# Altium integrated library GPDSE.IntLib: 634 symbols (part 5 of 7) (continued)
## Header_2x6
designator P?
Header, 2 Lines, 6 Columns, 12 Pins; LatestRevisionDate: 17-Jul-2002; LatestRevisionNote: Re-released for DXP Platform.; Publisher: Altium Limited
footprint HDR-F-2x6-1.27mm-SMD-4.57mm (Female Header, 2 lines, 6 columns, SMD, 4.57 mm length, 3D ASSMANN WSW components)
footprint HDR-M-2x6-2.54mm-180-9.2mm (Male Header, 2 lines, 6 columns, 180 degrees, 9.2 mm length)
footprint HDR-F-2x6-2.54mm-180-8.7mm (Female Header, 2 lines, 6 columns, 180 degrees, 8.7 mm length, 3D ASSMANN WSW components)
pins: 1, 2, 3, 4, 5, 6, 7, 8, 9, 10, 11, 12

## Header_2x7
designator P?
Header, 2 Lines, 7 Columns, 14 Pins; LatestRevisionDate: 17-Jul-2002; LatestRevisionNote: Re-released for DXP Platform.; Publisher: Altium Limited
footprint HDR-F-2x7-1.27mm-SMD-4.57mm (Female Header, 2 lines, 7 columns, SMD, 4.57 mm length, 3D ASSMANN WSW components)
footprint HDR-F-2x7-2.54mm-180-8.7mm (Female Header, 2 lines, 7 columns, 180 degrees, 8.7 mm length, 3D ASSMANN WSW components)
pins: 1, 2, 3, 4, 5, 6, 7, 8, 9, 10, 11, 12, 13, 14

## Header_2x8
designator P?
Header, 2 Lines, 8 Columns, 16 Pins; LatestRevisionDate: 17-Jul-2002; LatestRevisionNote: Re-released for DXP Platform.; Publisher: Altium Limited
footprint HDR-F-2x8-1.27mm-SMD-4.57mm (Female Header, 2 lines, 8 columns, SMD, 4.57 mm length, 3D ASSMANN WSW components)
footprint HDR-F-2x8-2.54mm-180-8.7mm (Female Header, 2 lines, 8 columns, 180 degrees, 8.7 mm length, 3D ASSMANN WSW components)
pins: 1, 2, 3, 4, 5, 6, 7, 8, 9, 10, 11, 12, 13, 14, 15, 16

## Header_2x9
designator P?
Header, 2 Lines, 9 Columns, 18 Pins; LatestRevisionDate: 17-Jul-2002; LatestRevisionNote: Re-released for DXP Platform.; Publisher: Altium Limited
footprint HDR-F-2x9-1.27mm-SMD-4.57mm (Female Header, 2 lines, 9 columns, SMD, 4.57 mm length, 3D ASSMANN WSW components)
footprint HDR-F-2x9-2.54mm-180-8.7mm (Female Header, 2 lines, 9 columns, 180 degrees, 8.7 mm length, 3D ASSMANN WSW components)
pins: 1, 2, 3, 4, 5, 6, 7, 8, 9, 10, 11, 12, 13, 14, 15, 16, 17, 18

## Header_2x10
designator P?
Header, 2 Lines, 10 Columns, 20 Pins; LatestRevisionDate: 17-Jul-2002; LatestRevisionNote: Re-released for DXP Platform.; Publisher: Altium Limited
footprint HDR-F-2x10-1.27mm-SMD-4.57mm (Female Header, 2 lines, 10 columns, SMD, 4.57 mm length, 3D ASSMANN WSW components)
footprint HDR-F-2x10-2.54mm-180-8.7mm (Female Header, 2 lines, 10 columns, 180 degrees, 8.7 mm length, 3D ASSMANN WSW components)
pins: 1, 2, 3, 4, 5, 6, 7, 8, 9, 10, 11, 12, 13, 14, 15, 16, 17, 18, 19, 20

## Header_2x11
designator P?
Header, 2 Lines, 11 Columns, 22 Pins; LatestRevisionDate: 17-Jul-2002; LatestRevisionNote: Re-released for DXP Platform.; Publisher: Altium Limited
footprint HDR-F-2x11-1.27mm-SMD-4.57mm (Female Header, 2 lines, 11 columns, SMD, 4.57 mm length, 3D ASSMANN WSW components)
footprint HDR-F-2x11-2.54mm-180-8.7mm (Female Header, 2 lines, 11 columns, 180 degrees, 8.7 mm length, 3D ASSMANN WSW components)
pins: 1, 2, 3, 4, 5, 6, 7, 8, 9, 10, 11, 12, 13, 14, 15, 16, 17, 18, 19, 20, 21, 22

## Header_2x12
designator P?
Header, 2 Lines, 12 Columns, 24 Pins; LatestRevisionDate: 17-Jul-2002; LatestRevisionNote: Re-released for DXP Platform.; Publisher: Altium Limited
footprint HDR-F-2x12-1.27mm-SMD-4.57mm (Female Header, 2 lines, 12 columns, SMD, 4.57 mm length, 3D ASSMANN WSW components)
footprint HDR-F-2x12-2.54mm-180-8.7mm (Female Header, 2 lines, 12 columns, 180 degrees, 8.7 mm length, 3D ASSMANN WSW components)
pins: 1, 2, 3, 4, 5, 6, 7, 8, 9, 10, 11, 12, 13, 14, 15, 16, 17, 18, 19, 20, 21, 22, 23, 24

## Header_2x13
designator P?
Header, 2 Lines, 13 Columns, 26 Pins; LatestRevisionDate: 17-Jul-2002; LatestRevisionNote: Re-released for DXP Platform.; Publisher: Altium Limited
footprint HDR-F-2x13-1.27mm-SMD-4.57mm (Female Header, 2 lines, 13 columns, SMD, 4.57 mm length, 3D ASSMANN WSW components)
footprint HDR-F-2x13-2.54mm-180-8.7mm (Female Header, 2 lines, 13 columns, 180 degrees, 8.7 mm length, 3D ASSMANN WSW components)
pins: 1, 2, 3, 4, 5, 6, 7, 8, 9, 10, 11, 12, 13, 14, 15, 16, 17, 18, 19, 20, 21, 22, 23, 24, 25, 26

## Header_2x14
designator P?
Header, 2 Lines, 14 Columns, 28 Pins; LatestRevisionDate: 17-Jul-2002; LatestRevisionNote: Re-released for DXP Platform.; Publisher: Altium Limited
footprint HDR-F-2x14-1.27mm-SMD-4.57mm (Female Header, 2 lines, 14 columns, SMD, 4.57 mm length, 3D ASSMANN WSW components)
footprint HDR-F-2x14-2.54mm-180-8.7mm (Female Header, 2 lines, 14 columns, 180 degrees, 8.7 mm length, 3D ASSMANN WSW components)
pins: 1, 2, 3, 4, 5, 6, 7, 8, 9, 10, 11, 12, 13, 14, 15, 16, 17, 18, 19, 20, 21, 22, 23, 24, 25, 26, 27, 28

## Header_2x15
designator P?
Header, 2 Lines, 15 Columns, 30 Pins; LatestRevisionDate: 17-Jul-2002; LatestRevisionNote: Re-released for DXP Platform.; Publisher: Altium Limited
footprint HDR-F-2x15-1.27mm-SMD-4.57mm (Female Header, 2 lines, 15 columns, SMD, 4.57 mm length, 3D ASSMANN WSW components)
footprint HDR-F-2x15-2.54mm-180-8.7mm (Female Header, 2 lines, 15 columns, 180 degrees, 8.7 mm length, 3D ASSMANN WSW components)
pins: 1, 2, 3, 4, 5, 6, 7, 8, 9, 10, 11, 12, 13, 14, 15, 16, 17, 18, 19, 20, 21, 22, 23, 24, 25, 26, 27, 28, 29, 30

## Header_2x16
designator P?
Header, 2 Lines, 16 Columns, 32 Pins; LatestRevisionDate: 17-Jul-2002; LatestRevisionNote: Re-released for DXP Platform.; Publisher: Altium Limited
footprint HDR-F-2x16-1.27mm-SMD-4.57mm (Female Header, 2 lines, 16 columns, SMD, 4.57 mm length, 3D ASSMANN WSW components)
footprint HDR-M-2x16-2.54mm-180-9.2mm (Male Header, 2 lines, 16 columns, 180 degrees, 9.2 mm length)
footprint HDR-F-2x16-2.54mm-180-8.7mm (Female Header, 2 lines, 16 columns, 180 degrees, 8.7 mm length, 3D ASSMANN WSW components)
pins: 1, 2, 3, 4, 5, 6, 7, 8, 9, 10, 11, 12, 13, 14, 15, 16, 17, 18, 19, 20, 21, 22, 23, 24, 25, 26, 27, 28, 29, 30, 31, 32

## Header_2x17
designator P?
Header, 2 Lines, 17 Columns, 34 Pins; LatestRevisionDate: 17-Jul-2002; LatestRevisionNote: Re-released for DXP Platform.; Publisher: Altium Limited
footprint HDR-F-2x17-1.27mm-SMD-4.57mm (Female Header, 2 lines, 17 columns, SMD, 4.57 mm length, 3D ASSMANN WSW components)
footprint HDR-F-2x17-2.54mm-180-8.7mm (Female Header, 2 lines, 17 columns, 180 degrees, 8.7 mm length, 3D ASSMANN WSW components)
pins: 1, 2, 3, 4, 5, 6, 7, 8, 9, 10, 11, 12, 13, 14, 15, 16, 17, 18, 19, 20, 21, 22, 23, 24, 25, 26, 27, 28, 29, 30, 31, 32, 33, 34

## Header_2x18
designator P?
Header, 2 Lines, 18 Columns, 36 Pins; LatestRevisionDate: 17-Jul-2002; LatestRevisionNote: Re-released for DXP Platform.; Publisher: Altium Limited
footprint HDR-F-2x18-1.27mm-SMD-4.57mm (Female Header, 2 lines, 18 columns, SMD, 4.57 mm length, 3D ASSMANN WSW components)
footprint HDR-F-2x18-2.54mm-180-8.7mm (Female Header, 2 lines, 18 columns, 180 degrees, 8.7 mm length, 3D ASSMANN WSW components)
pins: 1, 2, 3, 4, 5, 6, 7, 8, 9, 10, 11, 12, 13, 14, 15, 16, 17, 18, 19, 20, 21, 22, 23, 24, 25, 26, 27, 28, 29, 30, 31, 32, 33, 34, 35, 36

## Header_2x19
designator P?
Header, 2 Lines, 19 Columns, 38 Pins; LatestRevisionDate: 17-Jul-2002; LatestRevisionNote: Re-released for DXP Platform.; Publisher: Altium Limited
footprint HDR-F-2x19-1.27mm-SMD-4.57mm (Female Header, 2 lines, 19 columns, SMD, 4.57 mm length, 3D ASSMANN WSW components)
footprint HDR-F-2x19-2.54mm-180-8.7mm (Female Header, 2 lines, 19 columns, 180 degrees, 8.7 mm length, 3D ASSMANN WSW components)
pins: 1, 2, 3, 4, 5, 6, 7, 8, 9, 10, 11, 12, 13, 14, 15, 16, 17, 18, 19, 20, 21, 22, 23, 24, 25, 26, 27, 28, 29, 30, 31, 32, 33, 34, 35, 36, 37, 38

## Header_2x20
designator P?
Header, 2 Lines, 20 Columns, 40 Pins; LatestRevisionDate: 17-Jul-2002; LatestRevisionNote: Re-released for DXP Platform.; Publisher: Altium Limited
footprint HDR-M-2x20-2.54mm-180-9.2mm (Male Header, 2 lines 20 rows, 180 degrees, 9.2 mm length)
footprint HDR-F-2x20-1.27mm-SMD-4.57mm (Female Header, 2 lines, 20 columns, SMD, 4.57 mm length, 3D ASSMANN WSW components)
footprint HDR-F-2x20-2.54mm-180-8.7mm (Female Header, 2 lines, 20 columns, 180 degrees, 8.7 mm length, 3D ASSMANN WSW components)
pins: 1, 2, 3, 4, 5, 6, 7, 8, 9, 10, 11, 12, 13, 14, 15, 16, 17, 18, 19, 20, 21, 22, 23, 24, 25, 26, 27, 28, 29, 30, 31, 32, 33, 34, 35, 36, 37, 38, 39, 40

## Header_2x21
designator P?
Header, 2 Lines, 21 Columns, 42 Pins; LatestRevisionDate: 17-Jul-2002; LatestRevisionNote: Re-released for DXP Platform.; Publisher: Altium Limited
footprint HDR-F-2x21-1.27mm-SMD-4.57mm (Female Header, 2 lines, 21 columns, SMD, 4.57 mm length, 3D ASSMANN WSW components)
footprint HDR-F-2x21-2.54mm-180-8.7mm (Female Header, 2 lines, 21 columns, 180 degrees, 8.7 mm length, 3D ASSMANN WSW components)
pins: 1, 2, 3, 4, 5, 6, 7, 8, 9, 10, 11, 12, 13, 14, 15, 16, 17, 18, 19, 20, 21, 22, 23, 24, 25, 26, 27, 28, 29, 30, 31, 32, 33, 34, 35, 36, 37, 38, 39, 40, 41, 42

## Header_2x22
designator P?
Header, 2 Lines, 22 Columns, 44 Pins; LatestRevisionDate: 17-Jul-2002; LatestRevisionNote: Re-released for DXP Platform.; Publisher: Altium Limited
footprint HDR-F-2x22-1.27mm-SMD-4.57mm (Female Header, 2 lines, 22 columns, SMD, 4.57 mm length, 3D ASSMANN WSW components)
footprint HDR-F-2x22-2.54mm-180-8.7mm (Female Header, 2 lines, 22 columns, 180 degrees, 8.7 mm length, 3D ASSMANN WSW components)
pins: 1, 2, 3, 4, 5, 6, 7, 8, 9, 10, 11, 12, 13, 14, 15, 16, 17, 18, 19, 20, 21, 22, 23, 24, 25, 26, 27, 28, 29, 30, 31, 32, 33, 34, 35, 36, 37, 38, 39, 40, 41, 42, 43, 44

## Header_2x23
designator P?
Header, 2 Lines, 23 Columns, 46 Pins; LatestRevisionDate: 17-Jul-2002; LatestRevisionNote: Re-released for DXP Platform.; Publisher: Altium Limited
footprint HDR-F-2x23-1.27mm-SMD-4.57mm (Female Header, 2 lines, 23 columns, SMD, 4.57 mm length, 3D ASSMANN WSW components)
footprint HDR-F-2x23-2.54mm-180-8.7mm (Female Header, 2 lines, 23 columns, 180 degrees, 8.7 mm length, 3D ASSMANN WSW components)
pins: 1, 2, 3, 4, 5, 6, 7, 8, 9, 10, 11, 12, 13, 14, 15, 16, 17, 18, 19, 20, 21, 22, 23, 24, 25, 26, 27, 28, 29, 30, 31, 32, 33, 34, 35, 36, 37, 38, 39, 40, 41, 42, 43, 44, 45, 46

## Header_2x24
designator P?
Header, 2 Lines, 24 Columns, 48 Pins; LatestRevisionDate: 17-Jul-2002; LatestRevisionNote: Re-released for DXP Platform.; Publisher: Altium Limited
footprint HDR-F-2x24-1.27mm-SMD-4.57mm (Female Header, 2 lines, 24 columns, SMD, 4.57 mm length, 3D ASSMANN WSW components)
footprint HDR-F-2x24-2.54mm-180-8.7mm (Female Header, 2 lines, 24 columns, 180 degrees, 8.7 mm length, 3D ASSMANN WSW components)
pins: 1, 2, 3, 4, 5, 6, 7, 8, 9, 10, 11, 12, 13, 14, 15, 16, 17, 18, 19, 20, 21, 22, 23, 24, 25, 26, 27, 28, 29, 30, 31, 32, 33, 34, 35, 36, 37, 38, 39, 40, 41, 42, 43, 44, 45, 46, 47, 48

## Header_2x25
designator P?
Header, 2 Lines, 25 Columns, 50 Pins; LatestRevisionDate: 17-Jul-2002; LatestRevisionNote: Re-released for DXP Platform.; Publisher: Altium Limited
footprint HDR-F-2x25-1.27mm-SMD-4.57mm (Female Header, 2 lines, 25 columns, SMD, 4.57 mm length, 3D ASSMANN WSW components)
footprint HDR-F-2x25-2.54mm-180-8.7mm (Female Header, 2 lines, 25 columns, 180 degrees, 8.7 mm length, 3D ASSMANN WSW components)
pins: 1, 2, 3, 4, 5, 6, 7, 8, 9, 10, 11, 12, 13, 14, 15, 16, 17, 18, 19, 20, 21, 22, 23, 24, 25, 26, 27, 28, 29, 30, 31, 32, 33, 34, 35, 36, 37, 38, 39, 40, 41, 42, 43, 44, 45, 46, 47, 48, 49, 50

## Header_2x26
designator P?
Header, 2 Lines, 26 Columns, 52 Pins; LatestRevisionDate: 17-Jul-2002; LatestRevisionNote: Re-released for DXP Platform.; Publisher: Altium Limited
footprint HDR-F-2x26-2.54mm-180-8.7mm (Female Header, 2 lines, 26 columns, 180 degrees, 8.7 mm length, 3D ASSMANN WSW components)
pins: 1, 2, 3, 4, 5, 6, 7, 8, 9, 10, 11, 12, 13, 14, 15, 16, 17, 18, 19, 20, 21, 22, 23, 24, 25, 26, 27, 28, 29, 30, 31, 32, 33, 34, 35, 36, 37, 38, 39, 40, 41, 42, 43, 44, 45, 46, 47, 48, 49, 50, 51, 52

## Header_2x27
designator P?
Header, 2 Lines, 27 Columns, 54 Pins; LatestRevisionDate: 17-Jul-2002; LatestRevisionNote: Re-released for DXP Platform.; Publisher: Altium Limited
footprint HDR-F-2x27-2.54mm-180-8.7mm (Female Header, 2 lines, 27 columns, 180 degrees, 8.7 mm length, 3D ASSMANN WSW components)
pins: 1, 2, 3, 4, 5, 6, 7, 8, 9, 10, 11, 12, 13, 14, 15, 16, 17, 18, 19, 20, 21, 22, 23, 24, 25, 26, 27, 28, 29, 30, 31, 32, 33, 34, 35, 36, 37, 38, 39, 40, 41, 42, 43, 44, 45, 46, 47, 48, 49, 50, 51, 52, 53, 54

## Header_2x28
designator P?
Header, 2 Lines, 28 Columns, 56 Pins; LatestRevisionDate: 17-Jul-2002; LatestRevisionNote: Re-released for DXP Platform.; Publisher: Altium Limited
footprint HDR-F-2x28-2.54mm-180-8.7mm (Female Header, 2 lines, 28 columns, 180 degrees, 8.7 mm length, 3D ASSMANN WSW components)
pins: 1, 2, 3, 4, 5, 6, 7, 8, 9, 10, 11, 12, 13, 14, 15, 16, 17, 18, 19, 20, 21, 22, 23, 24, 25, 26, 27, 28, 29, 30, 31, 32, 33, 34, 35, 36, 37, 38, 39, 40, 41, 42, 43, 44, 45, 46, 47, 48, 49, 50, 51, 52, 53, 54, 55, 56

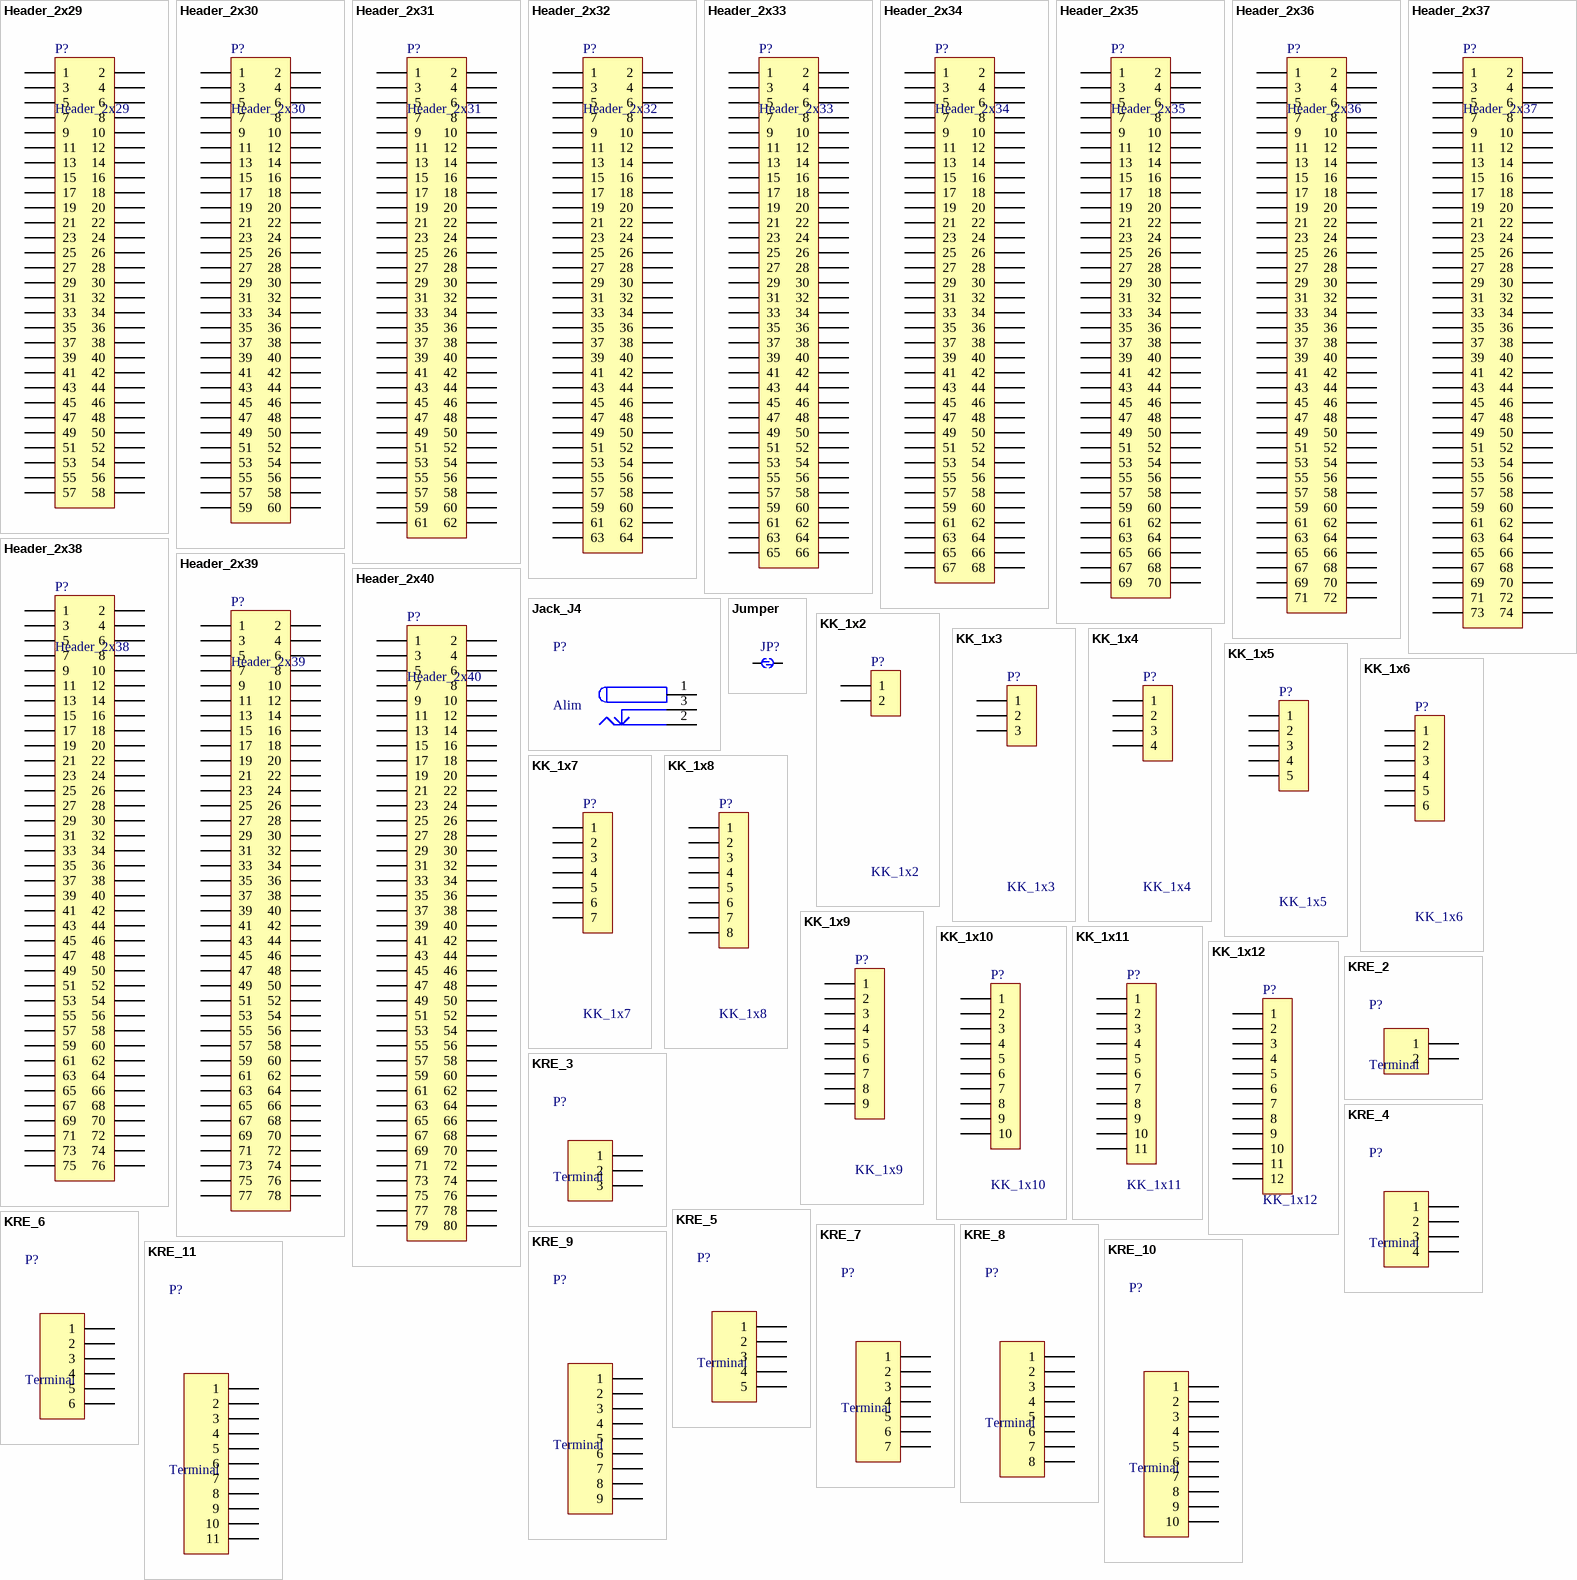
[diagram p22: symbols Header_2x29 to KRE_11]

## Header_2x29
designator P?
Header, 2 Lines, 29 Columns, 58 Pins; LatestRevisionDate: 17-Jul-2002; LatestRevisionNote: Re-released for DXP Platform.; Publisher: Altium Limited
footprint HDR-F-2x29-2.54mm-180-8.7mm (Female Header, 2 lines, 29 columns, 180 degrees, 8.7 mm length, 3D ASSMANN WSW components)
pins: 1, 2, 3, 4, 5, 6, 7, 8, 9, 10, 11, 12, 13, 14, 15, 16, 17, 18, 19, 20, 21, 22, 23, 24, 25, 26, 27, 28, 29, 30, 31, 32, 33, 34, 35, 36, 37, 38, 39, 40, 41, 42, 43, 44, 45, 46, 47, 48, 49, 50, 51, 52, 53, 54, 55, 56, 57, 58

## Header_2x30
designator P?
Header, 2 Lines, 30 Columns, 60 Pins; LatestRevisionDate: 17-Jul-2002; LatestRevisionNote: Re-released for DXP Platform.; Publisher: Altium Limited
footprint HDR-F-2x30-2.54mm-180-8.7mm (Female Header, 2 lines, 30 columns, 180 degrees, 8.7 mm length, 3D ASSMANN WSW components)
pins: 1, 2, 3, 4, 5, 6, 7, 8, 9, 10, 11, 12, 13, 14, 15, 16, 17, 18, 19, 20, 21, 22, 23, 24, 25, 26, 27, 28, 29, 30, 31, 32, 33, 34, 35, 36, 37, 38, 39, 40, 41, 42, 43, 44, 45, 46, 47, 48, 49, 50, 51, 52, 53, 54, 55, 56, 57, 58, 59, 60

## Header_2x31
designator P?
Header, 2 Lines, 31 Columns, 62 Pins; LatestRevisionDate: 17-Jul-2002; LatestRevisionNote: Re-released for DXP Platform.; Publisher: Altium Limited
footprint HDR-F-2x31-2.54mm-180-8.7mm (Female Header, 2 lines, 31 columns, 180 degrees, 8.7 mm length, 3D ASSMANN WSW components)
pins: 1, 2, 3, 4, 5, 6, 7, 8, 9, 10, 11, 12, 13, 14, 15, 16, 17, 18, 19, 20, 21, 22, 23, 24, 25, 26, 27, 28, 29, 30, 31, 32, 33, 34, 35, 36, 37, 38, 39, 40, 41, 42, 43, 44, 45, 46, 47, 48, 49, 50, 51, 52, 53, 54, 55, 56, 57, 58, 59, 60, 61, 62

## Header_2x32
designator P?
Header, 2 Lines, 32 Columns, 64 Pins; LatestRevisionDate: 17-Jul-2002; LatestRevisionNote: Re-released for DXP Platform.; Publisher: Altium Limited
footprint HDR-F-2x32-2.54mm-180-8.7mm (Female Header, 2 lines, 32 columns, 180 degrees, 8.7 mm length, 3D ASSMANN WSW components)
pins: 1, 2, 3, 4, 5, 6, 7, 8, 9, 10, 11, 12, 13, 14, 15, 16, 17, 18, 19, 20, 21, 22, 23, 24, 25, 26, 27, 28, 29, 30, 31, 32, 33, 34, 35, 36, 37, 38, 39, 40, 41, 42, 43, 44, 45, 46, 47, 48, 49, 50, 51, 52, 53, 54, 55, 56, 57, 58, 59, 60, 61, 62, 63, 64

## Header_2x33
designator P?
Header, 2 Lines, 33 Columns, 66 Pins; LatestRevisionDate: 17-Jul-2002; LatestRevisionNote: Re-released for DXP Platform.; Publisher: Altium Limited
footprint HDR-F-2x33-2.54mm-180-8.7mm (Female Header, 2 lines, 33 columns, 180 degrees, 8.7 mm length, 3D ASSMANN WSW components)
pins: 1, 2, 3, 4, 5, 6, 7, 8, 9, 10, 11, 12, 13, 14, 15, 16, 17, 18, 19, 20, 21, 22, 23, 24, 25, 26, 27, 28, 29, 30, 31, 32, 33, 34, 35, 36, 37, 38, 39, 40, 41, 42, 43, 44, 45, 46, 47, 48, 49, 50, 51, 52, 53, 54, 55, 56, 57, 58, 59, 60, 61, 62, 63, 64, 65, 66

## Header_2x34
designator P?
Header, 2 Lines, 34 Columns, 68 Pins; LatestRevisionDate: 17-Jul-2002; LatestRevisionNote: Re-released for DXP Platform.; Publisher: Altium Limited
footprint HDR-F-2x34-2.54mm-180-8.7mm (Female Header, 2 lines, 34 columns, 180 degrees, 8.7 mm length, 3D ASSMANN WSW components)
pins: 1, 2, 3, 4, 5, 6, 7, 8, 9, 10, 11, 12, 13, 14, 15, 16, 17, 18, 19, 20, 21, 22, 23, 24, 25, 26, 27, 28, 29, 30, 31, 32, 33, 34, 35, 36, 37, 38, 39, 40, 41, 42, 43, 44, 45, 46, 47, 48, 49, 50, 51, 52, 53, 54, 55, 56, 57, 58, 59, 60, 61, 62, 63, 64, 65, 66, 67, 68

## Header_2x35
designator P?
Header, 2 Lines, 35 Columns, 70 Pins; LatestRevisionDate: 17-Jul-2002; LatestRevisionNote: Re-released for DXP Platform.; Publisher: Altium Limited
footprint HDR-F-2x35-2.54mm-180-8.7mm (Female Header, 2 lines, 35 columns, 180 degrees, 8.7 mm length, 3D ASSMANN WSW components)
pins: 1, 2, 3, 4, 5, 6, 7, 8, 9, 10, 11, 12, 13, 14, 15, 16, 17, 18, 19, 20, 21, 22, 23, 24, 25, 26, 27, 28, 29, 30, 31, 32, 33, 34, 35, 36, 37, 38, 39, 40, 41, 42, 43, 44, 45, 46, 47, 48, 49, 50, 51, 52, 53, 54, 55, 56, 57, 58, 59, 60, 61, 62, 63, 64, 65, 66, 67, 68, 69, 70

## Header_2x36
designator P?
Header, 2 Lines, 36 Columns, 72 Pins; LatestRevisionDate: 17-Jul-2002; LatestRevisionNote: Re-released for DXP Platform.; Publisher: Altium Limited
footprint HDR-F-2x36-2.54mm-180-8.7mm (Female Header, 2 lines, 36 columns, 180 degrees, 8.7 mm length, 3D ASSMANN WSW components)
pins: 1, 2, 3, 4, 5, 6, 7, 8, 9, 10, 11, 12, 13, 14, 15, 16, 17, 18, 19, 20, 21, 22, 23, 24, 25, 26, 27, 28, 29, 30, 31, 32, 33, 34, 35, 36, 37, 38, 39, 40, 41, 42, 43, 44, 45, 46, 47, 48, 49, 50, 51, 52, 53, 54, 55, 56, 57, 58, 59, 60, 61, 62, 63, 64, 65, 66, 67, 68, 69, 70, 71, 72

## Header_2x37
designator P?
Header, 2 Lines, 37 Columns, 74 Pins; LatestRevisionDate: 17-Jul-2002; LatestRevisionNote: Re-released for DXP Platform.; Publisher: Altium Limited
footprint HDR-F-2x37-2.54mm-180-8.7mm (Female Header, 2 lines, 37 columns, 180 degrees, 8.7 mm length, 3D ASSMANN WSW components)
pins: 1, 2, 3, 4, 5, 6, 7, 8, 9, 10, 11, 12, 13, 14, 15, 16, 17, 18, 19, 20, 21, 22, 23, 24, 25, 26, 27, 28, 29, 30, 31, 32, 33, 34, 35, 36, 37, 38, 39, 40, 41, 42, 43, 44, 45, 46, 47, 48, 49, 50, 51, 52, 53, 54, 55, 56, 57, 58, 59, 60, 61, 62, 63, 64, 65, 66, 67, 68, 69, 70, 71, 72, 73, 74

## Header_2x38
designator P?
Header, 2 Lines, 38 Columns, 76 Pins; LatestRevisionDate: 17-Jul-2002; LatestRevisionNote: Re-released for DXP Platform.; Publisher: Altium Limited
footprint HDR-F-2x38-2.54mm-180-8.7mm (Female Header, 2 lines, 38 columns, 180 degrees, 8.7 mm length, 3D ASSMANN WSW components)
pins: 1, 2, 3, 4, 5, 6, 7, 8, 9, 10, 11, 12, 13, 14, 15, 16, 17, 18, 19, 20, 21, 22, 23, 24, 25, 26, 27, 28, 29, 30, 31, 32, 33, 34, 35, 36, 37, 38, 39, 40, 41, 42, 43, 44, 45, 46, 47, 48, 49, 50, 51, 52, 53, 54, 55, 56, 57, 58, 59, 60, 61, 62, 63, 64, 65, 66, 67, 68, 69, 70, 71, 72, 73, 74, 75, 76

## Header_2x39
designator P?
Header, 2 Lines, 39 Columns, 78 Pins; LatestRevisionDate: 17-Jul-2002; LatestRevisionNote: Re-released for DXP Platform.; Publisher: Altium Limited
footprint HDR-F-2x39-2.54mm-180-8.7mm (Female Header, 2 lines, 39 columns, 180 degrees, 8.7 mm length, 3D ASSMANN WSW components)
pins: 1, 2, 3, 4, 5, 6, 7, 8, 9, 10, 11, 12, 13, 14, 15, 16, 17, 18, 19, 20, 21, 22, 23, 24, 25, 26, 27, 28, 29, 30, 31, 32, 33, 34, 35, 36, 37, 38, 39, 40, 41, 42, 43, 44, 45, 46, 47, 48, 49, 50, 51, 52, 53, 54, 55, 56, 57, 58, 59, 60, 61, 62, 63, 64, 65, 66, 67, 68, 69, 70, 71, 72, 73, 74, 75, 76, 77, 78

## Header_2x40
designator P?
Header, 2 Lines, 40 Columns, 80 Pins; LatestRevisionDate: 17-Jul-2002; LatestRevisionNote: Re-released for DXP Platform.; Publisher: Altium Limited
footprint HDR-F-2x40-2.54mm-180-8.7mm (Female Header, 2 lines, 40 columns, 180 degrees, 8.7 mm length, 3D ASSMANN WSW components)
pins: 1, 2, 3, 4, 5, 6, 7, 8, 9, 10, 11, 12, 13, 14, 15, 16, 17, 18, 19, 20, 21, 22, 23, 24, 25, 26, 27, 28, 29, 30, 31, 32, 33, 34, 35, 36, 37, 38, 39, 40, 41, 42, 43, 44, 45, 46, 47, 48, 49, 50, 51, 52, 53, 54, 55, 56, 57, 58, 59, 60, 61, 62, 63, 64, 65, 66, 67, 68, 69, 70, 71, 72, 73, 74, 75, 76, 77, 78, 79, 80

## Jack_J4
designator P?, comment Alim
Jack J4
footprint J4-DC-005 (Jack J4 DC-005, 9 mm Width, 14.2 mm Long, 11 mm Height, 3D Teodor Luchian)
footprint J4-DC-002 (Jack J4 DC-002, 5 mm Width, 11.1 mm Long, 11 mm Height)
pins: 1, 2, 3

## Jumper
designator JP?  (value not drawn)
footprint JP01 (Jumper)
footprint HDR-M-1x2-2.54mm-180-9.2mm (Male Header, 1 line 2 rows, 180 degrees, 9.2 mm length)
pins: 1, 2

## KK_1x2
designator P?
KK Header, 1 Line, 2 Columns, 2 Pins; LatestRevisionDate: 17-Jul-2002; LatestRevisionNote: Re-released for DXP Platform.; Publisher: Altium Limited
footprint KK-M-1x2-2.54mm-180 (Molex KK Male Header, 2 rows, 180 degrees, 3D Andrew Mellor)
footprint KK_M_1x2_2.54mm_90 (Molex KK Male Header, 2 rows, 90 degrees, 3D Murat Ugurlu)
pins: 1, 2

## KK_1x3
designator P?
KK Header, 1 Line, 3 Columns, 3 Pins; LatestRevisionDate: 17-Jul-2002; LatestRevisionNote: Re-released for DXP Platform.; Publisher: Altium Limited
footprint KK-M-1x3-2.54mm-180 (Molex KK Male Header, 3 rows, 180 degrees, 3D Andrew Mellor)
footprint KK_M_1x3_2.54mm_90 (Molex KK Male Header, 3 rows, 90 degrees, 3D Murat Ugurlu)
pins: 1, 2, 3

## KK_1x4
designator P?
KK Header, 1 Line, 4 Columns, 4 Pins; LatestRevisionDate: 17-Jul-2002; LatestRevisionNote: Re-released for DXP Platform.; Publisher: Altium Limited
footprint KK-M-1x4-2.54mm-180 (Molex KK Male Header, 4 rows, 180 degrees, 3D Andrew Mellor)
footprint KK_M_1x4_2.54mm_90 (Molex KK Male Header, 4 rows, 90 degrees, 3D Murat Ugurlu)
pins: 1, 2, 3, 4

## KK_1x5
designator P?
KK Header, 1 Line, 5 Columns, 5 Pins; LatestRevisionDate: 17-Jul-2002; LatestRevisionNote: Re-released for DXP Platform.; Publisher: Altium Limited
footprint KK-M-1x5-2.54mm-180 (Molex KK Male Header, 5 rows, 180 degrees, 3D Andrew Mellor)
footprint KK_M_1x5_2.54mm_90 (Molex KK Male Header, 5 rows, 90 degrees, 3D Murat Ugurlu)
pins: 1, 2, 3, 4, 5

## KK_1x6
designator P?
KK Header, 1 Line, 6 Columns, 6 Pins; LatestRevisionDate: 17-Jul-2002; LatestRevisionNote: Re-released for DXP Platform.; Publisher: Altium Limited
footprint KK-M-1x6-2.54mm-180 (Molex KK Male Header, 6 rows, 180 degrees, 3D Andrew Mellor)
footprint KK_M_1x6_2.54mm_90 (Molex KK Male Header, 6 rows, 90 degrees, 3D Murat Ugurlu)
pins: 1, 2, 3, 4, 5, 6

## KK_1x7
designator P?
KK Header, 1 Line, 7 Columns, 7 Pins; LatestRevisionDate: 17-Jul-2002; LatestRevisionNote: Re-released for DXP Platform.; Publisher: Altium Limited
footprint KK-M-1x7-2.54mm-180 (Molex KK Male Header, 7 rows, 180 degrees, 3D Andrew Mellor)
footprint KK_M_1x7_2.54mm_90 (Molex KK Male Header, 7 rows, 90 degrees)
pins: 1, 2, 3, 4, 5, 6, 7

## KK_1x8
designator P?
KK Header, 1 Line, 8 Columns, 8 Pins; LatestRevisionDate: 17-Jul-2002; LatestRevisionNote: Re-released for DXP Platform.; Publisher: Altium Limited
footprint KK-M-1x8-2.54mm-180 (Molex KK Male Header, 8 rows, 180 degrees, 3D Andrew Mellor)
footprint KK_M_1x8_2.54mm_90 (Molex KK Male Header, 8 rows, 90 degrees)
pins: 1, 2, 3, 4, 5, 6, 7, 8

## KK_1x9
designator P?
KK Header, 1 Line, 9 Columns, 9 Pins; LatestRevisionDate: 17-Jul-2002; LatestRevisionNote: Re-released for DXP Platform.; Publisher: Altium Limited
footprint KK-M-1x9-2.54mm-180 (Molex KK Male Header, 9 rows, 180 degrees, 3D Andrew Mellor)
footprint KK_M_1x9_2.54mm_90 (Molex KK Male Header, 9 rows, 90 degrees)
pins: 1, 2, 3, 4, 5, 6, 7, 8, 9

## KK_1x10
designator P?
KK Header, 1 Line, 10 Columns, 10 Pins; LatestRevisionDate: 17-Jul-2002; LatestRevisionNote: Re-released for DXP Platform.; Publisher: Altium Limited
footprint KK-M-1x10-2.54mm-180 (Molex KK Male Header, 10 rows, 180 degrees, 3D Andrew Mellor)
footprint KK_M_1x10_2.54mm_90 (Molex KK Male Header, 10 rows, 90 degrees)
pins: 1, 2, 3, 4, 5, 6, 7, 8, 9, 10

## KK_1x11
designator P?
KK Header, 1 Line, 11 Columns, 11 Pins; LatestRevisionDate: 17-Jul-2002; LatestRevisionNote: Re-released for DXP Platform.; Publisher: Altium Limited
footprint KK-M-1x11-2.54mm-180 (Molex KK Male Header, 11 rows, 180 degrees, 3D Andrew Mellor)
pins: 1, 2, 3, 4, 5, 6, 7, 8, 9, 10, 11

## KK_1x12
designator P?
KK Header, 1 Line, 12 Columns, 12 Pins; LatestRevisionDate: 17-Jul-2002; LatestRevisionNote: Re-released for DXP Platform.; Publisher: Altium Limited
footprint KK-M-1x12-2.54mm-180 (Molex KK Male Header, 12 rows, 180 degrees, 3D Andrew Mellor)
pins: 1, 2, 3, 4, 5, 6, 7, 8, 9, 10, 11, 12

## KRE_2
designator P?, comment Terminal
Terminal Block 1x2
footprint KRE_2 (Terminal Block 2 pins)
pins: 1, 2

## KRE_3
designator P?, comment Terminal
Terminal Block 1x3
footprint KRE_3 (Terminal Block 3 pins)
pins: 1, 2, 3

## KRE_4
designator P?, comment Terminal
Terminal Block 1x4
footprint KRE_4 (Terminal Block 4 pins)
pins: 1, 2, 3, 4

## KRE_5
designator P?, comment Terminal
Terminal Block 1x5
footprint KRE_5 (Terminal Block 5 pins)
pins: 1, 2, 3, 4, 5

## KRE_6
designator P?, comment Terminal
Terminal Block 1x6
footprint KRE_6 (Terminal Block 6 pins)
pins: 1, 2, 3, 4, 5, 6

## KRE_7
designator P?, comment Terminal
Terminal Block 1x7
footprint KRE_7 (Terminal Block 7 pins)
pins: 1, 2, 3, 4, 5, 6, 7

## KRE_8
designator P?, comment Terminal
Terminal Block 1x8
footprint KRE_8 (Terminal Block 8 pins)
pins: 1, 2, 3, 4, 5, 6, 7, 8

## KRE_9
designator P?, comment Terminal
Terminal Block 1x9
footprint KRE_9 (Terminal Block 9 pins)
pins: 1, 2, 3, 4, 5, 6, 7, 8, 9

## KRE_10
designator P?, comment Terminal
Terminal Block 1x10
footprint KRE_10 (Terminal Block 10 pins)
pins: 1, 2, 3, 4, 5, 6, 7, 8, 9, 10

## KRE_11
designator P?, comment Terminal
Terminal Block 1x11
footprint KRE_11 (Terminal Block 11 pins)
pins: 1, 2, 3, 4, 5, 6, 7, 8, 9, 10, 11

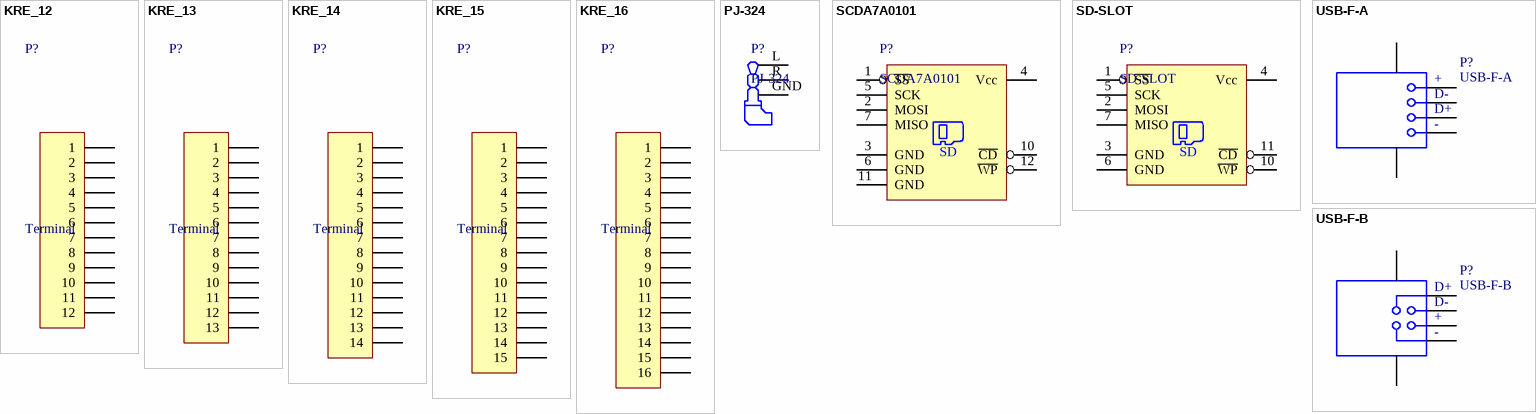
[diagram p23: symbols KRE_12 to USB-F-B]

## KRE_12
designator P?, comment Terminal
Terminal Block 1x12
footprint KRE_12 (Terminal Block 12 pins)
pins: 1, 2, 3, 4, 5, 6, 7, 8, 9, 10, 11, 12

## KRE_13
designator P?, comment Terminal
Terminal Block 1x13
footprint KRE_13 (Terminal Block 13 pins)
pins: 1, 2, 3, 4, 5, 6, 7, 8, 9, 10, 11, 12, 13

## KRE_14
designator P?, comment Terminal
Terminal Block 1x14
footprint KRE_14 (Terminal Block 14 pins)
pins: 1, 2, 3, 4, 5, 6, 7, 8, 9, 10, 11, 12, 13, 14

## KRE_15
designator P?, comment Terminal
Terminal Block 1x15
footprint KRE_15 (Terminal Block 15 pins)
pins: 1, 2, 3, 4, 5, 6, 7, 8, 9, 10, 11, 12, 13, 14, 15

## KRE_16
designator P?, comment Terminal
Terminal Block 1x16
footprint KRE_16 (Terminal Block 16 pins)
pins: 1, 2, 3, 4, 5, 6, 7, 8, 9, 10, 11, 12, 13, 14, 15, 16

## PJ-324
designator P?
Jack Stereo J2 PJ-324
footprint PJ-324 (PJ-324 Stereo J2 Jack); pin to pad GND>1 L>5 R>2
pins: GND, L Left, R Right

## SCDA7A0101
designator P?
SD card connector ALPS SCDA7A0101
footprint SD-SCDA7A0101 (Footprint not found)
pins: 1 ~{SS}, 2 MOSI, 3 GND, 4 Vcc, 5 SCK, 6 GND, 7 MISO, 10 ~{CD}, 11 GND, 12 ~{WP}
text: SD

## SD-SLOT
designator P?
SD card connector 1138022
footprint SD-693063020911 (WÜRTH ELEKTRONIK ConCARD SD Card Connector Push & Pull - Short Type - with Card Detection - 9 Pins)
pins: 1 ~{SS}, 2 MOSI, 3 GND, 4 Vcc, 5 SCK, 6 GND, 7 MISO, 10 ~{WP}, 11 ~{CD}
text: SD

## USB-F-A
designator P?
USB Female connector, Type A
footprint USB-F-A-DIP (USB Female connector, Type A, DIP)
pins: 1 +, 2 D-, 3 D+, 4 -, 5, 6

## USB-F-B
designator P?
USB Female connector, Type B
footprint USB-F-B-DIP (USB Female connector, Type B, DIP)
pins: 1 +, 2 D-, 3 D+, 4 -, 5, 6


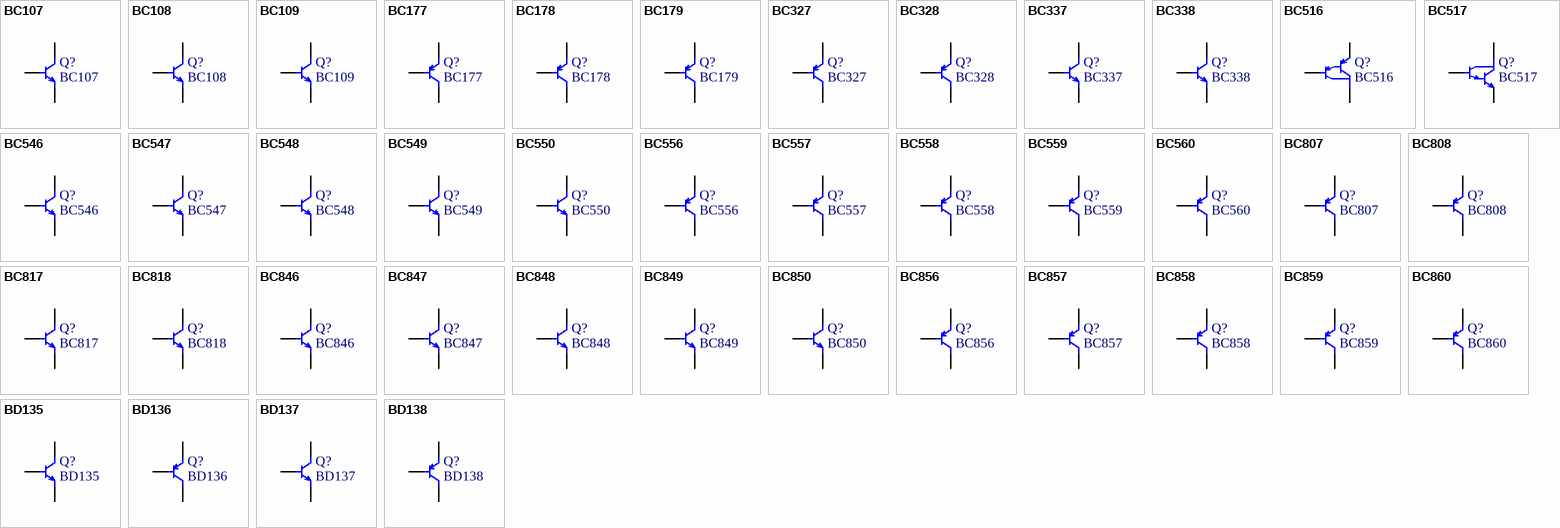
[diagram p24: symbols BC107 to BD138]

## BC107
designator Q?
NPN Bipolar Transistor; Complementary Part: BC177; Collector-Base Voltage (Vcb): 50 V; Collector-Emitter Voltage (Vce): 45 V; Emitter-Base Voltage (Veb): 6 V; Collector Current (Ic): 100 mA; Collector Peak Current (Icp): 200 mA; Total Power Dissipation (Ptot): 300 mW; DC Current Gain Min (hfe): 110; DC Current Gain Max (hfe): 450; Transition Frequency (fT): 100 MHz; Base Peak Current (Ibp): 200 mA
footprint TO-18/EBC (Transistor EBC)
pins: B, C, E

## BC108
designator Q?
NPN Bipolar Transistor; Complementary Part: BC178; Collector-Base Voltage (Vcb): 30 V; Collector-Emitter Voltage (Vce): 20 V; Emitter-Base Voltage (Veb): 5 V; Collector Current (Ic): 100 mA; Collector Peak Current (Icp): 200 mA; Total Power Dissipation (Ptot): 300 mW; DC Current Gain Min (hfe): 110; DC Current Gain Max (hfe): 800; Transition Frequency (fT): 100 MHz; Base Peak Current (Ibp): 200 mA
footprint TO-18/EBC (Transistor EBC)
pins: B, C, E

## BC109
designator Q?
NPN Bipolar Transistor; Complementary Part: BC179; Collector-Base Voltage (Vcb): 30 V; Collector-Emitter Voltage (Vce): 20 V; Emitter-Base Voltage (Veb): 5 V; Collector Current (Ic): 100 mA; Collector Peak Current (Icp): 200 mA; Total Power Dissipation (Ptot): 300 mW; DC Current Gain Min (hfe): 200; DC Current Gain Max (hfe): 800; Transition Frequency (fT): 100 MHz; Base Peak Current (Ibp): 200 mA
footprint TO-18/EBC (Transistor EBC)
pins: B, C, E

## BC177
designator Q?
PNP Bipolar Transistor; Complementary Part: BC107; Collector-Base Voltage (Vcb): -50 V; Collector-Emitter Voltage (Vce): -45 V; Emitter-Base Voltage (Veb): -5 V; Collector Current (Ic): -100 mA; Collector Peak Current (Icp): -200 mA; Total Power Dissipation (Ptot): 300 mW; DC Current Gain Min (hfe): 125; DC Current Gain Max (hfe): 500; Transition Frequency (fT): 100 MHz; Base Peak Current (Ibp): -200 mA
footprint TO-18/EBC (Transistor EBC)
pins: B, C, E

## BC178
designator Q?
PNP Bipolar Transistor; Complementary Part: BC108; Collector-Base Voltage (Vcb): -30 V; Collector-Emitter Voltage (Vce): -25 V; Emitter-Base Voltage (Veb): -5 V; Collector Current (Ic): -100 mA; Collector Peak Current (Icp): -200 mA; Total Power Dissipation (Ptot): 300 mW; DC Current Gain Min (hfe): 125; DC Current Gain Max (hfe): 500; Transition Frequency (fT): 100 MHz; Base Peak Current (Ibp): -100 mA
footprint TO-18/EBC (Transistor EBC)
pins: B, C, E

## BC179
designator Q?
PNP Bipolar Transistor; Complementary Part: BC109; Collector-Base Voltage (Vcb): -30 V; Collector-Emitter Voltage (Vce): -25 V; Emitter-Base Voltage (Veb): -5 V; Collector Current (Ic): -100 mA; Collector Peak Current (Icp): -200 mA; Total Power Dissipation (Ptot): 300 mW; DC Current Gain Min (hfe): 125; DC Current Gain Max (hfe): 500; Transition Frequency (fT): 100 MHz; Base Peak Current (Ibp): -100 mA
footprint TO-18/EBC (Transistor EBC)
pins: B, C, E

## BC327
designator Q?
PNP Epitaxial Silicon Transistor; Complementary Part: BC337; Collector-Emitter Voltage (Vce): -50 V; Emitter-Base Voltage (Veb): -5 V; Collector Current (Ic): -800 mA; Total Power Dissipation (Ptot): 625 mW; DC Current Gain Min (hfe): 100; DC Current Gain Max (hfe): 630; Transition Frequency (fT): 100 MHz
footprint TO-92/CBE (Transistor Outline Package, Case Style 92 CBE; 3D Sergey Atanov)
pins: B, C, E

## BC328
designator Q?
PNP Epitaxial Silicon Transistor; Complementary Part: BC338; Collector-Emitter Voltage (Vce): -30 V; Emitter-Base Voltage (Veb): -5 V; Collector Current (Ic): -800 mA; Total Power Dissipation (Ptot): 625 mW; DC Current Gain Min (hfe): 40; DC Current Gain Max (hfe): 630; Transition Frequency (fT): 100 MHz
footprint TO-92/CBE (Transistor Outline Package, Case Style 92 CBE; 3D Sergey Atanov)
pins: B, C, E

## BC337
designator Q?
NPN Epitaxial Silicon Transistor; Complementary Part: BC327; Collector-Emitter Voltage (Vce): 50 V; Emitter-Base Voltage (Veb): 5 V; Collector Current (Ic): 800 mA; Total Power Dissipation (Ptot): 625 mW; DC Current Gain Min (hfe): 100; DC Current Gain Max (hfe): 630; Transition Frequency (fT): 100 MHz
footprint TO-92/CBE (Transistor Outline Package, Case Style 92 CBE; 3D Sergey Atanov)
pins: B, C, E